# Altium footprint library CADTcommon.PcbLib: 503 footprints (part 28 of 32)
Each footprint in its own frame and in the unit in brackets; x right, y up, seen from the top. Pads: shape width x height; smd on the part's side, far side on the other; paste and mask are expansions set on the pad; w line width, h text height; cw(c..) or ccw(c..) is an arc to the next point about the centre after c.
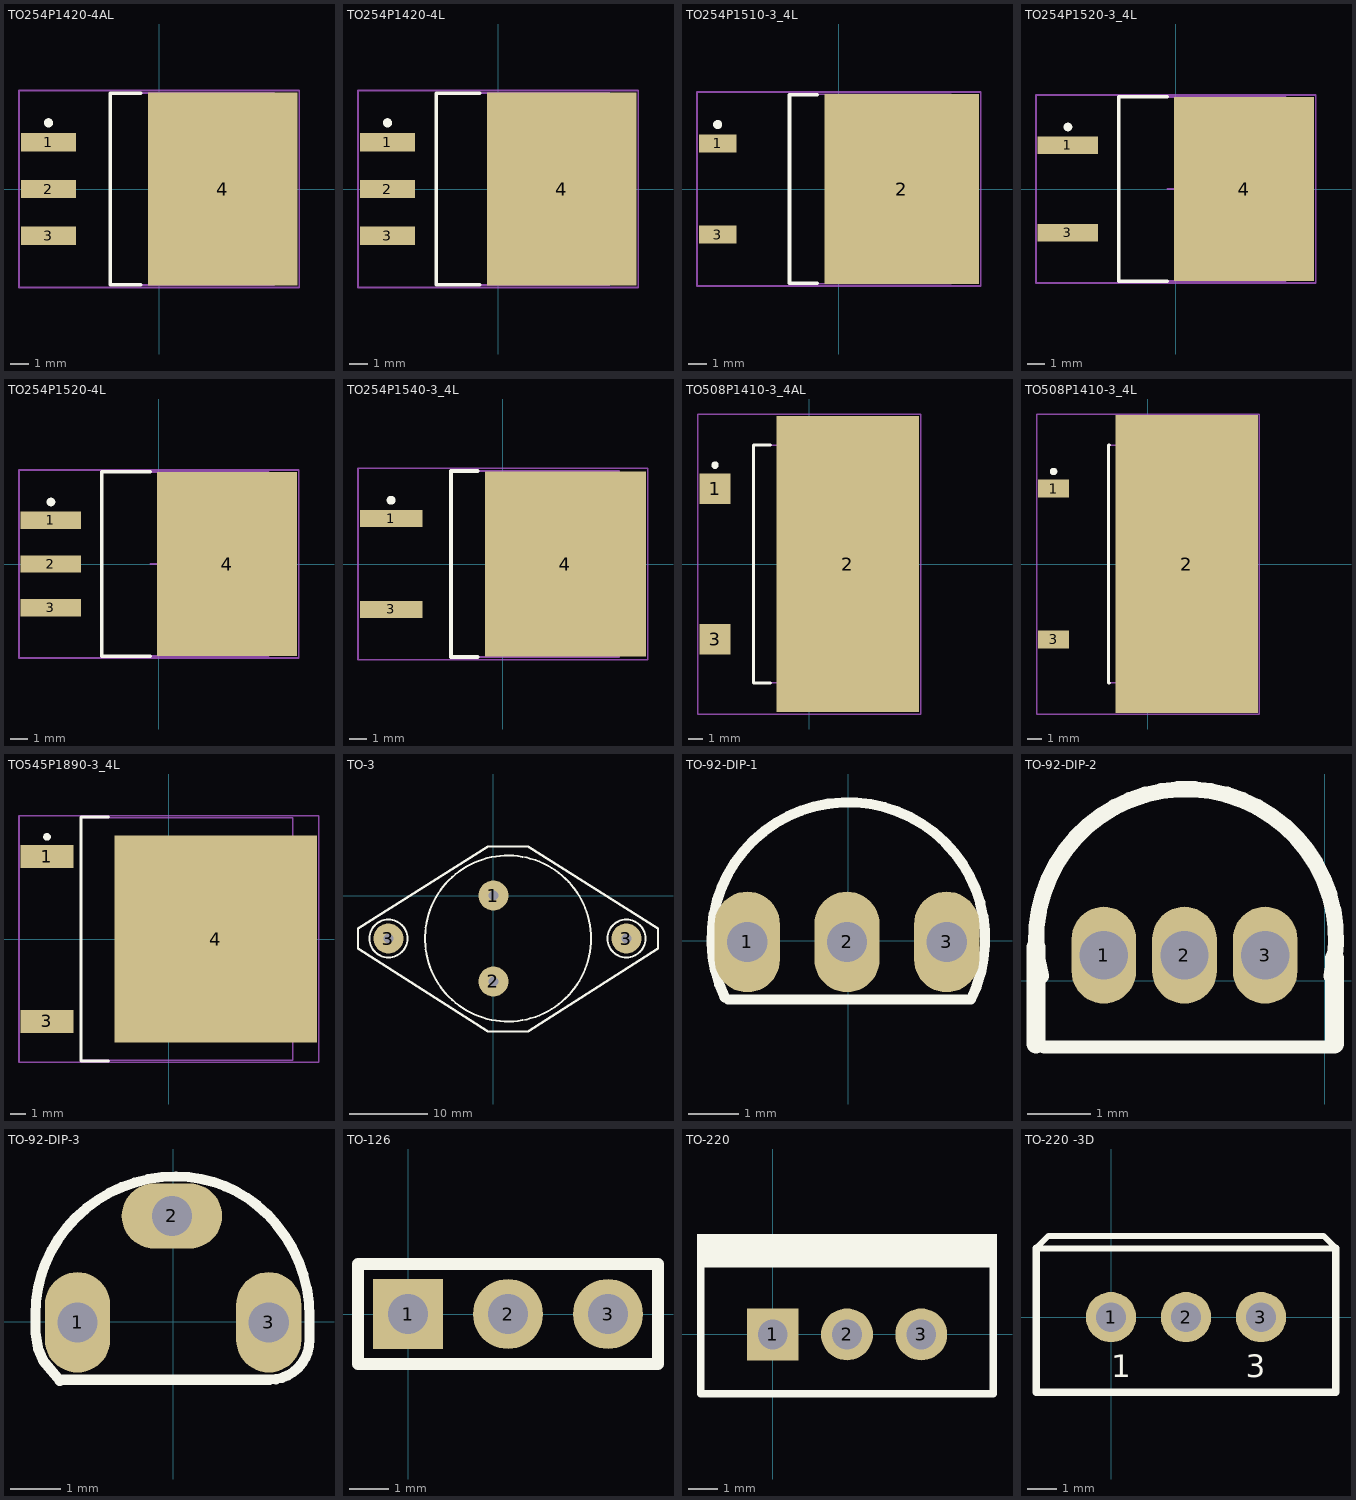
[diagram p27: the footprints below, top view; thin cyan lines are the x and y axes]

## TO254P1420-4AL [mm] "D2-PAK, 4-Leads, Body 8.6x10.2mm, Pitch 2.54mm, Lead Span 14.2mm, IPC High Density"
height 4.64
pads (4):
  rect 3x1 smd: 1(-6,2.54) 2(-6,0) 3(-6,-2.54)
  rect 8.1x10.45 smd: 4(3.45,0)
Top Overlay:
  circle w0.25: c-6,3.59 r0.125
  lines w0.2: -1,-5.2 -2.65,-5.2 -2.65,5.2 -1,5.2
Mechanical 13:
  lines w0.1: -2.65,-5.2 -2.65,5.2 6.24,5.2 6.24,-5.2 -2.65,-5.2
Mechanical 15:
  lines w0.1: -0.5,0 0.5,0 ; 0,-0.5 0,0.5 ; -7.6,-5.35 -7.6,5.35 7.6,5.35 7.6,-5.35 -7.6,-5.35
3D body: height 4.64, standoff 0, extent -2.649,-5.199 6.239,5.199

## TO254P1420-4L [mm] "D2-PAK, 4-Leads, Body 8.9x10.1mm, Pitch 2.54mm, Lead Span 14.2mm, IPC High Density"
height 4.65
pads (4):
  rect 3x1 smd: 1(-6,2.54) 2(-6,0) 3(-6,-2.54)
  rect 8.1x10.45 smd: 4(3.45,0)
Top Overlay:
  circle w0.25: c-6,3.59 r0.125
  lines w0.2: -1,-5.2 -3.35,-5.2 -3.35,5.2 -1,5.2
Mechanical 13:
  lines w0.1: -3.35,-5.2 6.05,-5.2 6.05,5.2 -3.35,5.2 -3.35,-5.2
Mechanical 15:
  lines w0.1: -0.5,0 0.5,0 ; 0,-0.5 0,0.5 ; -7.6,-5.35 7.6,-5.35 7.6,5.35 -7.6,5.35 -7.6,-5.35
3D body: height 4.65, standoff 0, extent -3.35,-5.2 6.05,5.2

## TO254P1510-3_4L [mm] "D2-PAK, 4-Leads, Body 8.8x10.4mm, Pitch 2.54mm, Lead Span 15.1mm, IPC High Density"
height 4.69
pads (3):
  rect 2.1x1 smd: 1(-6.75,2.54) 3(-6.75,-2.54)
  rect 8.6x10.6 smd: 2(3.5,0)
Top Overlay:
  circle w0.25: c-6.75,3.59 r0.125
  lines w0.2: -1.2,-5.25 -2.75,-5.25 -2.75,5.25 -1.2,5.25
Mechanical 13:
  lines w0.1: -2.75,-5.275 -2.75,5.275 6.25,5.275 6.25,-5.275 -2.75,-5.275
Mechanical 15:
  lines w0.1: -0.5,0 0.5,0 ; 0,-0.5 0,0.5 ; -7.9,-5.4 -7.9,5.4 7.9,5.4 7.9,-5.4 -7.9,-5.4
3D body: height 4.69, standoff 0, extent -2.75,-5.275 6.25,5.275

## TO254P1520-3_4L [mm] "D2-PAK, 4-Leads, Body 9x10.2mm, Pitch 2.54mm, Lead Span 15.2mm, IPC High Density"
height 4.83
pads (3):
  rect 3.5x1 smd: 1(-6.25,2.54) 3(-6.25,-2.54)
  rect 8.1x10.65 smd: 4(3.95,0)
Top Overlay:
  circle w0.25: c-6.25,3.59 r0.125
  lines w0.2: -0.5,-5.35 -3.3,-5.35 -3.3,5.35 -0.5,5.35
Mechanical 13:
  lines w0.1: -3.3,-5.325 6.35,-5.325 6.35,5.325 -3.3,5.325 -3.3,-5.325
Mechanical 15:
  lines w0.1: -0.5,0 0.5,0 ; 0,-0.5 0,0.5 ; -8.1,-5.45 8.1,-5.45 8.1,5.45 -8.1,5.45 -8.1,-5.45
3D body: height 4.83, standoff 0, extent -3.3,-5.325 6.35,5.325

## TO254P1520-4L [mm] "D2-PAK, 4-Leads, Body 9x10.2mm, Pitch 2.54mm, Lead Span 15.2mm, IPC High Density"
height 4.83
pads (4):
  rect 3.5x1 smd: 1(-6.25,2.54) 2(-6.25,0) 3(-6.25,-2.54)
  rect 8.1x10.65 smd: 4(3.95,0)
Top Overlay:
  circle w0.25: c-6.25,3.59 r0.125
  lines w0.2: -0.5,-5.35 -3.3,-5.35 -3.3,5.35 -0.5,5.35
Mechanical 13:
  lines w0.1: -3.3,-5.325 -3.3,5.325 6.35,5.325 6.35,-5.325 -3.3,-5.325
Mechanical 15:
  lines w0.1: -0.5,0 0.5,0 ; 0,-0.5 0,0.5 ; -8.1,-5.45 -8.1,5.45 8.1,5.45 8.1,-5.45 -8.1,-5.45
3D body: height 4.83, standoff 0, extent -3.3,-5.325 6.35,5.325

## TO254P1540-3_4L [mm] "D2-PAK, 4-Leads, Body 9.2x10.2mm, Pitch 2.54mm, Lead Span 15.4mm, IPC High Density"
height 4.6
pads (3):
  rect 3.5x0.95 smd: 1(-6.25,2.54) 3(-6.25,-2.54)
  rect 9x10.35 smd: 4(3.5,0)
Top Overlay:
  circle w0.25: c-6.25,3.565 r0.125
  lines w0.2: -1.4,-5.2 -2.9,-5.2 -2.9,5.2 -1.4,5.2
Mechanical 13:
  lines w0.1: -2.9,-5.2 -2.9,5.2 6.5,5.2 6.5,-5.2 -2.9,-5.2
Mechanical 15:
  lines w0.1: -0.5,0 0.5,0 ; 0,-0.5 0,0.5 ; -8.1,-5.35 -8.1,5.35 8.1,5.35 8.1,-5.35 -8.1,-5.35
3D body: height 4.6, standoff 0, extent -2.9,-5.2 6.5,5.2

## TO508P1410-3_4AL [mm] "Single-Ended SM Package, 4-Leads, Body 10.6x16mm, Pitch 5.08mm, Lead Span 14.1mm, IPC High Density"
height 5.97
pads (3):
  rect 2.1x2.05 smd: 1(-6.35,5.08) 3(-6.35,-5.08)
  rect 9.6x19.95 smd: 2(2.6,0)
Top Overlay:
  circle w0.25: c-6.35,6.655 r0.125
  lines w0.2: -2.6,-8 -3.75,-8 -3.75,8 -2.6,8
Mechanical 13:
  lines w0.1: -3.75,-8 -3.75,8 7.04,8 7.04,-8 -3.75,-8
Mechanical 15:
  lines w0.1: -0.5,0 0.5,0 ; 0,-0.5 0,0.5 ; -7.5,-10.1 -7.5,10.1 7.5,10.1 7.5,-10.1 -7.5,-10.1
3D body: height 5.97, standoff 0, extent -3.75,-8 7.04,8

## TO508P1410-3_4L [mm] "Single-Ended SM Package, 4-Leads, Body 9.5x16mm, Pitch 5.08mm, Lead Span 14.1mm, IPC High Density"
height 6
pads (3):
  rect 2.1x1.2 smd: 1(-6.35,5.08) 3(-6.35,-5.08)
  rect 9.6x20.05 smd: 2(2.6,0)
Top Overlay:
  circle w0.25: c-6.35,6.23 r0.125
  lines w0.2: -2.6,-8 -2.65,-8 -2.65,8 -2.6,8
Mechanical 13:
  lines w0.1: -2.65,-8 7,-8 7,8 -2.65,8 -2.65,-8
Mechanical 15:
  lines w0.1: -0.5,0 0.5,0 ; 0,-0.5 0,0.5 ; -7.5,-10.1 7.5,-10.1 7.5,10.1 -7.5,10.1 -7.5,-10.1
3D body: height 6, standoff 0, extent -2.65,-8 7,8

## TO545P1890-3_4L [mm] "D3-PAK, 4-Leads, Body 13.9x16mm, Pitch 5.45mm, Lead Span 18.9mm, IPC High Density"
height 5.1
pads (3):
  rect 3.5x1.5 smd: 1(-8.05,5.45) 3(-8.05,-5.45)
  rect 13.4x13.65 smd: 4(3.1,0)
Top Overlay:
  circle w0.25: c-8.05,6.75 r0.125
  lines w0.2: -4,-8.05 -5.8,-8.05 -5.8,8.05 -4,8.05
Mechanical 13:
  lines w0.1: -5.8,-8.025 -5.8,8.025 8.2,8.025 8.2,-8.025 -5.8,-8.025
Mechanical 15:
  lines w0.1: -0.5,0 0.5,0 ; 0,-0.5 0,0.5 ; -9.9,-8.15 -9.9,8.15 9.9,8.15 9.9,-8.15 -9.9,-8.15
3D body: height 5.1, standoff 0, extent -5.8,-8.025 8.2,8.025

## TO-3 [mil]
pads (4):
  round 150 hole 50: 1(0,0) 2(0,-430) 3(-525,-215) 3(665,-215)
Top Overlay:
  circle w10: c-525,-215 r95
  circle w10: c665,-215 r95
  circle w10: c73,-215 r415
  lines w12: -677,-265 -677,-165 -27,245 173,245 823,-165 823,-265 173,-680 -27,-680 -677,-265

## TO-92-DIP-1 [mm]
pads (3):
  oval 1.3x2 hole 0.8: 1(-2.007,-0.025) 2(-0.025,-0.025) 3(1.956,-0.025)
Top Overlay:
  lines w0.203: -2.458,-1.126 cw(c0,0.032) 2.438,-1.168 -2.388,-1.168
3D body: height 8, standoff 3, extent -2.6,-1.668 2.601,2.601

## TO-92-DIP-2 [mil]
pads (3):
  oval 40x60 hole 30: 1(-137,16) 2(-87,16) 3(-37,16)
Top Overlay:
  lines w8: -174,-41 6,-41
  lines w10: -176,3 cw(c-86,26) 4,3
  lines w12: -179,-39 -179,21 ; 6,-39 6,14

## TO-92-DIP-3 [mm]
pads (3):
  oval 1.3x2 hole 0.8: 1(-1.905,-0.011) 3(1.905,-0.011)
  oval 2x1.3 hole 0.8: 2(-0.025,2.108)
Top Overlay:
  lines w0.2: -2.744,0.141 cw(c-0.019,0.141) -1.946,2.068 cw(c0.054,0.068) 0.054,2.896 cw(c0.054,0.327) 1.87,2.143 cw(c-0.177,0.096) 2.718,0.096 2.718,-0.358 cw(c1.921,-0.358) 1.921,-1.154
  lines w0.203: -2.744,0.141 -2.744,-0.214 -2.693,-0.519 -2.591,-0.773 -2.258,-1.173 ; -2.236,-1.154 1.921,-1.154
3D body: height 8, standoff 3, extent -2.6,-1.49 2.601,2.779

## TO-126 [mil]
pads (3):
  rect 70x70 hole 40: 1(0,0)
  round 70 hole 40: 2(100,0) 3(200,0)
Top Overlay:
  lines w12: -50,-50 -50,50 250,50 250,-50 -50,-50

## TO-220 [mil]
pads (3):
  rect 70x70 hole 40: 1(0,0)
  round 70 hole 40: 2(100,0) 3(200,0)
Top Overlay:
  rectangle: -102,95 302,135
  lines w10: -97,-80 -97,95 297,95 297,-80 -97,-80

## TO-220 -3D [mm]
pads (3):
  round 1.7 hole 1: 1(0,0) 2(2.54,0) 3(5.08,0)
Top Overlay:
  lines w0.2: -2.54,2.328 -2.117,2.752 7.197,2.752 7.62,2.328 -2.54,2.328
  lines w0.254: -2.54,2.328 -2.54,-2.529 -2.529,-2.54 7.609,-2.54 7.62,-2.529 7.62,2.328
  text "1" at 0,-2.032 h0.76
  text "3" at 4.572,-2.032 h0.76
3D body: height 18.8, standoff -9.98, extent -2.385,-2.108 7.515,2.392